# Altium footprint library Elettronica FM.PcbLib: 387 footprints (part 24 of 25)
Each footprint in its own frame and in the unit in brackets; x right, y up, seen from the top. Pads: shape width x height; smd on the part's side, far side on the other; paste and mask are expansions set on the pad; w line width, h text height; cw(c..) or ccw(c..) is an arc to the next point about the centre after c.
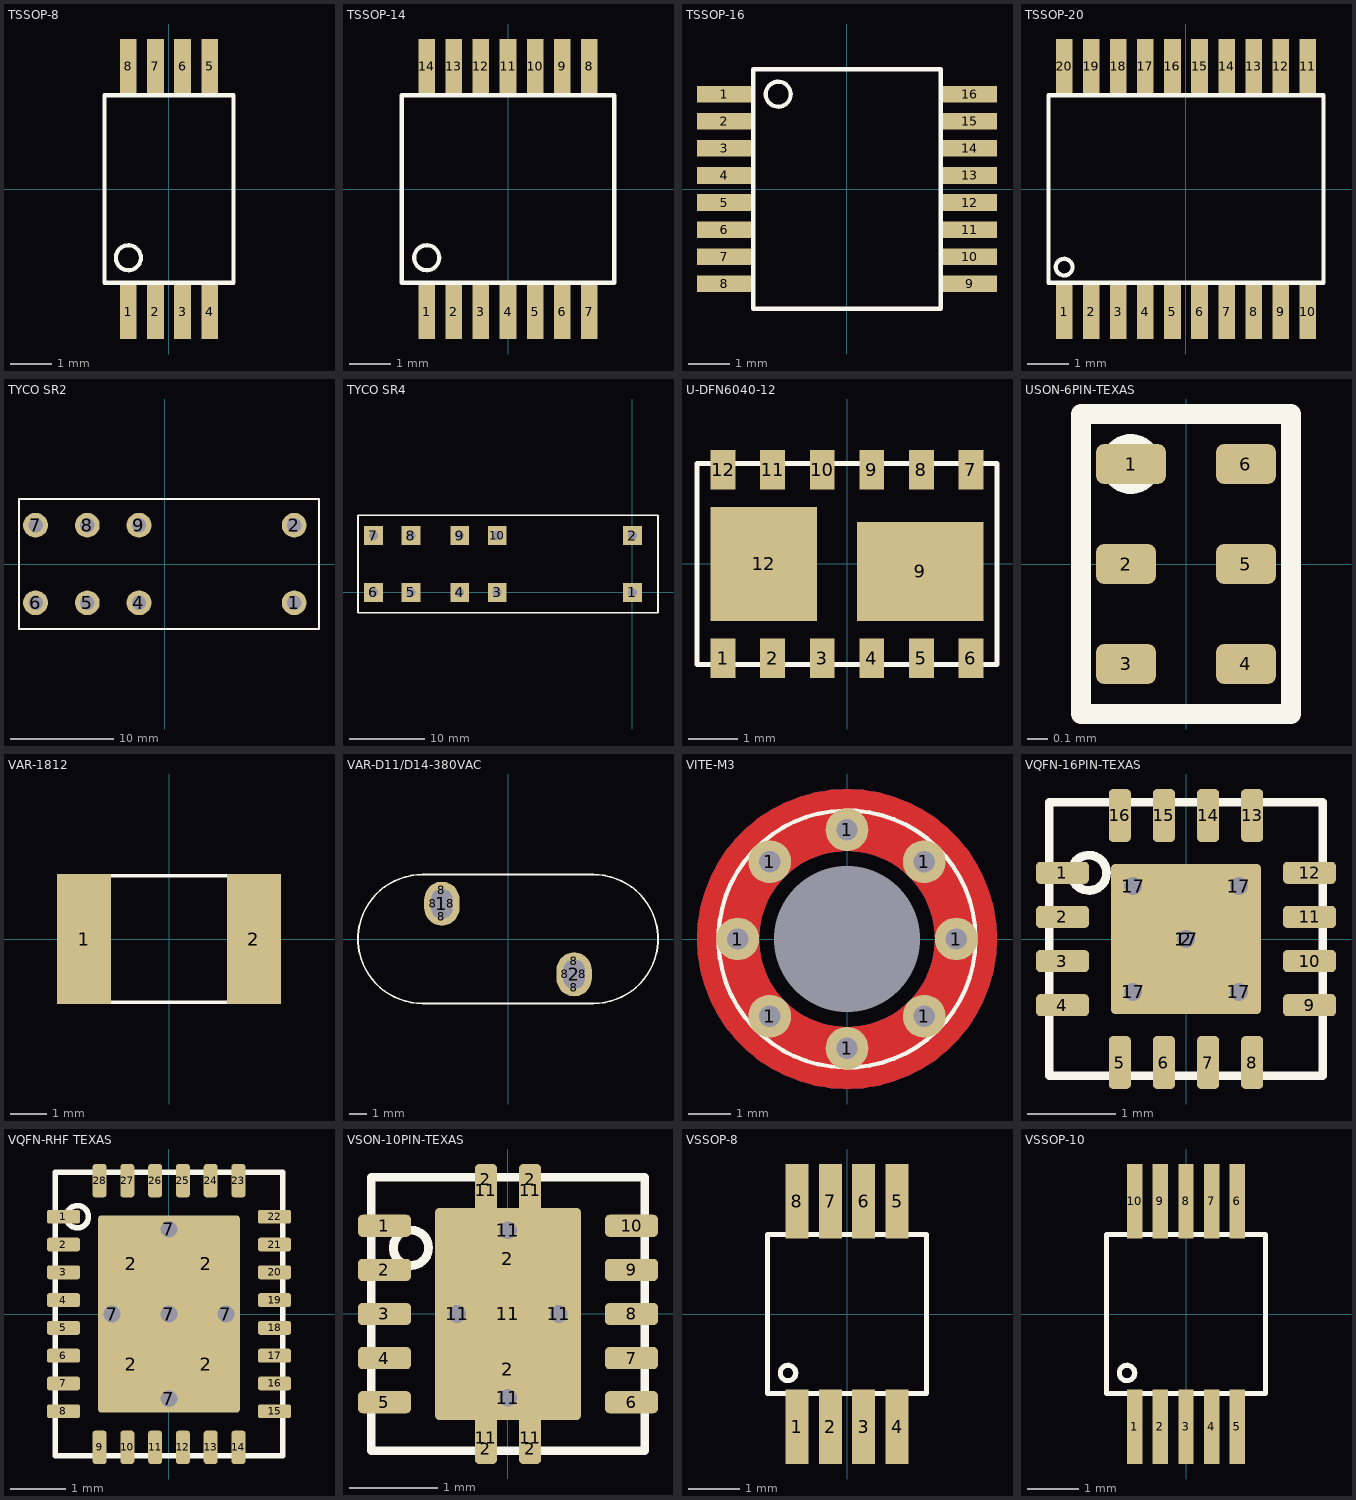
[diagram p23: the footprints below, top view; thin cyan lines are the x and y axes]

## TSSOP-8 [mm]
pads (8):
  rect 0.4x1.3 smd: 1(-0.975,-2.95) 2(-0.325,-2.95) 3(0.325,-2.95) 4(0.975,-2.95) 5(0.975,2.95) 6(0.325,2.95) 7(-0.325,2.95) 8(-0.975,2.95)
Top Overlay:
  circle w0.1: c-0.975,-1.65 r0.3
  lines w0.1: -1.55,-2.25 -1.55,2.25 1.55,2.25 1.55,-2.25 -1.55,-2.25
3D body: height 1.05, standoff 0, extent -1.55,-2.25 1.55,2.25

## TSSOP-14 [mm]
pads (14):
  rect 0.4x1.3 smd: 1(-1.95,-2.95) 2(-1.3,-2.95) 3(-0.65,-2.95) 4(0,-2.95) 5(0.65,-2.95) 6(1.3,-2.95) 7(1.95,-2.95) 8(1.95,2.95) 9(1.3,2.95) 10(0.65,2.95) 11(0,2.95) 12(-0.65,2.95) 13(-1.3,2.95) 14(-1.95,2.95)
Top Overlay:
  circle w0.1: c-1.95,-1.65 r0.3
  lines w0.1: -2.55,-2.25 -2.55,2.25 2.55,2.25 2.55,-2.25 -2.55,-2.25
3D body "TSSOP14.stp": height 1.1, standoff 0, extent -2.5,-3.2 2.5,3.2

## TSSOP-16 [mm]
pads (16):
  rect 1.3x0.4 smd: 1(-2.95,2.275) 2(-2.95,1.625) 3(-2.95,0.975) 4(-2.95,0.325) 5(-2.95,-0.325) 6(-2.95,-0.975) 7(-2.95,-1.625) 8(-2.95,-2.275) 9(2.95,-2.275) 10(2.95,-1.625) 11(2.95,-0.975) 12(2.95,-0.325) 13(2.95,0.325) 14(2.95,0.975) 15(2.95,1.625) 16(2.95,2.275)
Top Overlay:
  circle w0.1: c-1.65,2.275 r0.3
  lines w0.1: -2.25,-2.875 2.25,-2.875 2.25,2.875 -2.25,2.875 -2.25,-2.875

## TSSOP-20 [mm]
pads (20):
  rect 0.4x1.3 smd: 1(-2.925,-2.95) 2(-2.275,-2.95) 3(-1.625,-2.95) 4(-0.975,-2.95) 5(-0.325,-2.95) 6(0.325,-2.95) 7(0.975,-2.95) 8(1.625,-2.95) 9(2.275,-2.95) 10(2.925,-2.95) 11(2.925,2.95) 12(2.275,2.95) 13(1.625,2.95) 14(0.975,2.95) 15(0.325,2.95) 16(-0.325,2.95) 17(-0.975,2.95) 18(-1.625,2.95) 19(-2.275,2.95) 20(-2.925,2.95)
Top Overlay:
  circle w0.1: c-2.925,-1.875 r0.2
  lines w0.1: -3.3,-2.25 -3.3,2.25 3.3,2.25 3.3,-2.25 -3.3,-2.25
3D body: height 1.1, standoff 0.15, extent -3.3,-2.25 3.3,2.25

## TYCO SR2 [mm]
pads (8):
  round 2.4 hole 1.4 mask+0.1: 1(12.5,-3.75) 2(12.5,3.75) 4(-2.5,-3.75) 5(-7.5,-3.75) 6(-12.5,-3.75) 7(-12.5,3.75) 8(-7.5,3.75) 9(-2.5,3.75)
Top Overlay:
  lines w0.203: -14.1,-6.3 14.9,-6.3 14.9,6.3 -14.1,6.3 -14.1,-6.3
3D body: height 25.5, standoff 0, extent -14.1,-6.3 14.9,6.3

## TYCO SR4 [mm]
pads (10):
  rect 2.5x2.5 hole 1.2 mask+0.1: 1(0,0) 2(0,7.6) 3(-18.05,0) 4(-23.05,0) 5(-29.55,0) 6(-34.55,0) 7(-34.55,7.6) 8(-29.55,7.6) 9(-23.05,7.6) 10(-18.05,7.6)
Top Overlay:
  lines w0.203: -36.6,-2.7 -36.6,10.3 3.4,10.3 3.4,-2.7 -36.6,-2.7

## U-DFN6040-12 [mm]
height 1.9
pads (14):
  rect 0.5x0.8 smd paste-0.025 mask+0.05: 1(-2.5,-1.9) 2(-1.5,-1.9) 3(-0.5,-1.9) 4(0.5,-1.9) 5(1.5,-1.9) 6(2.5,-1.9) 7(2.5,1.9) 8(1.5,1.9) 9(0.5,1.9) 10(-0.5,1.9) 11(-1.5,1.9) 12(-2.5,1.9)
  rect 2.55x2 smd paste-0.025 mask+0.05: 9(1.475,-0.15)
  rect 2.15x2.3 smd paste-0.025 mask+0.05: 12(-1.675,0)
Top Overlay:
  lines w0.1: -3.025,-2.025 -3.025,2.025 3.025,2.025 3.025,-2.025 -3.025,-2.025
3D body: height 1, standoff 0, extent -3.167,-5 -2.667,-3.9
3D body: height 1, standoff 0, extent -1.897,-5 -1.397,-3.9
3D body: height 1, standoff 0, extent -0.627,-5 -0.127,-3.9
3D body: height 1, standoff 0, extent 0.643,-5 1.143,-3.9
3D body: height 1, standoff 0, extent 0.643,0.1 1.143,1.2
3D body: height 1, standoff 0, extent -0.627,0.1 -0.127,1.2
3D body: height 1, standoff 0, extent -3.167,0.1 -2.667,1.2
3D body: height 1, standoff 0, extent -1.897,0.1 -1.397,1.2

## USON-6PIN-TEXAS [mm]
height 1.9
pads (6):
  rrect40% 0.35x0.2 smd paste+0 mask+0.05: 1(-0.275,0.5)
  rrect40% 0.3x0.2 smd paste+0 mask+0.05: 2(-0.3,0) 3(-0.3,-0.5) 4(0.3,-0.5) 5(0.3,0) 6(0.3,0.5)
Top Overlay:
  circle w0.1: c-0.275,0.5 r0.1
  lines w0.1: -0.525,-0.75 -0.525,0.75 0.525,0.75 0.525,-0.75 -0.525,-0.75
3D body: height 0.6, standoff 0, extent -0.525,-0.75 0.525,0.75

## VAR-1812 [mm]
pads (2):
  rect 1.5x3.6 smd: 1(-2.35,0) 2(2.35,0)
Top Overlay:
  lines w0.1: -1.8,-1.75 -1.8,1.75 ; 1.8,-1.75 1.8,1.75 ; -2.55,-1.75 -2.55,1.75 2.55,1.75 2.55,-1.75 -2.55,-1.75

## VAR-D11/D14-380VAC [mm]
pads (10):
  oval 2x2.5 hole 1.2 slot 1.7 at 90 deg mask+0.101: 1(-3.75,2) 2(3.75,-2)
  round 0.85 on Top Overlay mask+0.1: 8(-4.25,2) 8(-3.75,1.25) 8(-3.75,2.75) 8(-3.25,2) 8(3.25,-2) 8(3.75,-2.75) 8(3.75,-1.25) 8(4.25,-2)
Top Overlay:
  lines w0.1: -4.85,-3.65 cw(c-4.85,0) -4.85,3.65 4.85,3.65 cw(c4.85,0) 4.85,-3.65 -4.85,-3.65
3D body: height 20.5, standoff 3.5, extent -8.5,-3.65 8.5,3.65
3D body: height 5, standoff 0, extent 2.758,-2.998 4.75,-1.002
3D body: height 5, standoff 0, extent -4.742,1.002 -2.75,2.998
3D body: height 1.9, standoff -3.1, extent -4.172,1.576 -3.325,2.424
3D body: height 1.9, standoff -3.1, extent 3.328,-2.424 4.175,-1.576

## VITE-M3 [mm]
pads (9):
  round 0 hole 3.4 unplated mask-5: 0(0,0)
  round 1 hole 0.5: 1(-2.55,0) 1(-1.803,-1.803) 1(-1.803,1.803) 1(0,-2.55) 1(0,2.55) 1(1.803,-1.803) 1(1.803,1.803) 1(2.55,0)
Top Layer:
  circle w1.45: c0,0 r2.775
Bottom Layer:
  circle w1.45: c0,0 r2.775
Top Overlay:
  circle w0.1: c0,0 r3
Bottom Overlay:
  circle w0.1: c0,0 r3.5
Top Solder:
  circle w1.45: c0,0 r2.775

## VQFN-16PIN-TEXAS [mm]
height 1.9
pads (23):
  rrect40% 0.6x0.25 smd paste+0 mask+0.07: 1(-1.4,0.75) 2(-1.4,0.25) 3(-1.4,-0.25) 4(-1.4,-0.75) 9(1.4,-0.75) 10(1.4,-0.25) 11(1.4,0.25) 12(1.4,0.75)
  rrect5% 1.55x1.55 on Top Paste mask+0.1: 2(0,0)
  rrect40% 0.25x0.6 smd paste+0 mask+0.07: 5(-0.75,-1.4) 6(-0.25,-1.4) 7(0.25,-1.4) 8(0.75,-1.4) 13(0.75,1.4) 14(0.25,1.4) 15(-0.25,1.4) 16(-0.75,1.4)
  round 0.5 hole 0.2 mask+0.075: 17(-0.6,-0.6) 17(-0.6,0.6) 17(0,0) 17(0.6,-0.6) 17(0.6,0.6)
  rrect5% 1.7x1.7 smd paste-50 mask+0.07: 17(0,0)
Top Overlay:
  circle w0.1: c-1.1,0.75 r0.2
  lines w0.1: -1.55,-1.55 -1.55,1.55 1.55,1.55 1.55,-1.55 -1.55,-1.55
3D body: height 1, standoff 0, extent -1.55,-1.55 1.55,1.55

## VQFN-RHF TEXAS [mm]
height 1.9
pads (38):
  rrect40% 0.6x0.25 smd paste+0 mask+0.07: 1(-1.9,1.75) 2(-1.9,1.25) 3(-1.9,0.75) 4(-1.9,0.25) 5(-1.9,-0.25) 6(-1.9,-0.75) 7(-1.9,-1.25) 8(-1.9,-1.75) 15(1.9,-1.75) 16(1.9,-1.25) 17(1.9,-0.75) 18(1.9,-0.25) 19(1.9,0.25) 20(1.9,0.75) 21(1.9,1.25) 22(1.9,1.75)
  rrect50% 1.15x1.55 on Top Paste mask+0.1: 2(-0.675,-0.9) 2(-0.675,0.9) 2(0.675,-0.9) 2(0.675,0.9)
  round 0.5 hole 0.3 mask+0.075: 7(-1.025,0) 7(0,-1.525) 7(0,0) 7(0,1.525) 7(1.025,0)
  rrect4% 2.55x3.55 smd paste-50 mask+0.07: 7(0,0)
  rrect40% 0.25x0.6 smd paste+0 mask+0.07: 9(-1.25,-2.4) 10(-0.75,-2.4) 11(-0.25,-2.4) 12(0.25,-2.4) 13(0.75,-2.4) 14(1.25,-2.4) 23(1.25,2.4) 24(0.75,2.4) 25(0.25,2.4) 26(-0.25,2.4) 27(-0.75,2.4) 28(-1.25,2.4)
Top Overlay:
  circle w0.1: c-1.65,1.75 r0.2
  lines w0.1: -2.05,-2.55 2.05,-2.55 2.05,2.55 -2.05,2.55 -2.05,-2.55

## VSON-10PIN-TEXAS [mm]
height 1.9
pads (25):
  rrect40% 0.6x0.25 smd paste+0 mask+0.07: 1(-1.4,1) 2(-1.4,0.5) 3(-1.4,0) 4(-1.4,-0.5) 5(-1.4,-1) 6(1.4,-1) 7(1.4,-0.5) 8(1.4,0) 9(1.4,0.5) 10(1.4,1)
  rrect40% 0.25x0.35 on Top Paste mask+0.1: 2(-0.25,-1.525) 2(-0.25,1.525) 2(0.25,-1.525) 2(0.25,1.525)
  rrect5% 1.5x1.05 on Top Paste mask+0.1: 2(0,-0.625) 2(0,0.625)
  round 0.5 hole 0.2 mask+0.075: 11(-0.575,0) 11(0,-0.95) 11(0,0.95) 11(0.575,0)
  rrect40% 0.25x0.6 smd paste-5 mask+0.07: 11(-0.25,-1.4) 11(-0.25,1.4) 11(0.25,-1.4) 11(0.25,1.4)
  rrect5% 1.65x2.4 smd paste-50 mask+0.07: 11(0,0)
Top Overlay:
  circle w0.1: c-1.1,0.75 r0.2
  lines w0.1: -1.55,-1.55 -1.55,1.55 1.55,1.55 1.55,-1.55 -1.55,-1.55
3D body: height 1, standoff 0, extent -1.55,-1.55 1.55,1.55

## VSSOP-8 [mm]
pads (8):
  rect 0.45x1.45 smd paste-0.05 mask+0.05: 1(-0.975,-2.2) 2(-0.325,-2.2) 3(0.325,-2.2) 4(0.975,-2.2) 5(0.975,2.2) 6(0.325,2.2) 7(-0.325,2.2) 8(-0.975,2.2)
Top Overlay:
  circle w0.1: c-1.15,-1.15 r0.15
  lines w0.1: -1.55,-1.55 -1.55,1.55 1.55,1.55 1.55,-1.55 -1.55,-1.55
3D body: height 1.1, standoff 0, extent -1.55,-1.55 1.55,1.55

## VSSOP-10 [mm]
pads (10):
  rect 0.3x1.45 smd paste+0 mask+0.05: 1(-1,-2.2) 2(-0.5,-2.2) 3(0,-2.2) 4(0.5,-2.2) 5(1,-2.2) 6(1,2.2) 7(0.5,2.2) 8(0,2.2) 9(-0.5,2.2) 10(-1,2.2)
Top Overlay:
  circle w0.1: c-1.15,-1.15 r0.15
  lines w0.1: -1.55,-1.55 1.55,-1.55 1.55,1.55 -1.55,1.55 -1.55,-1.55
3D body: height 1.1, standoff 0, extent -1.55,-1.55 1.55,1.55